# Altium footprint library Iris.PcbLib: 90 footprints (part 3 of 6)
Each footprint in its own frame and in the unit in brackets; x right, y up, seen from the top. Pads: shape width x height; smd on the part's side, far side on the other; paste and mask are expansions set on the pad; w line width, h text height; cw(c..) or ccw(c..) is an arc to the next point about the centre after c.
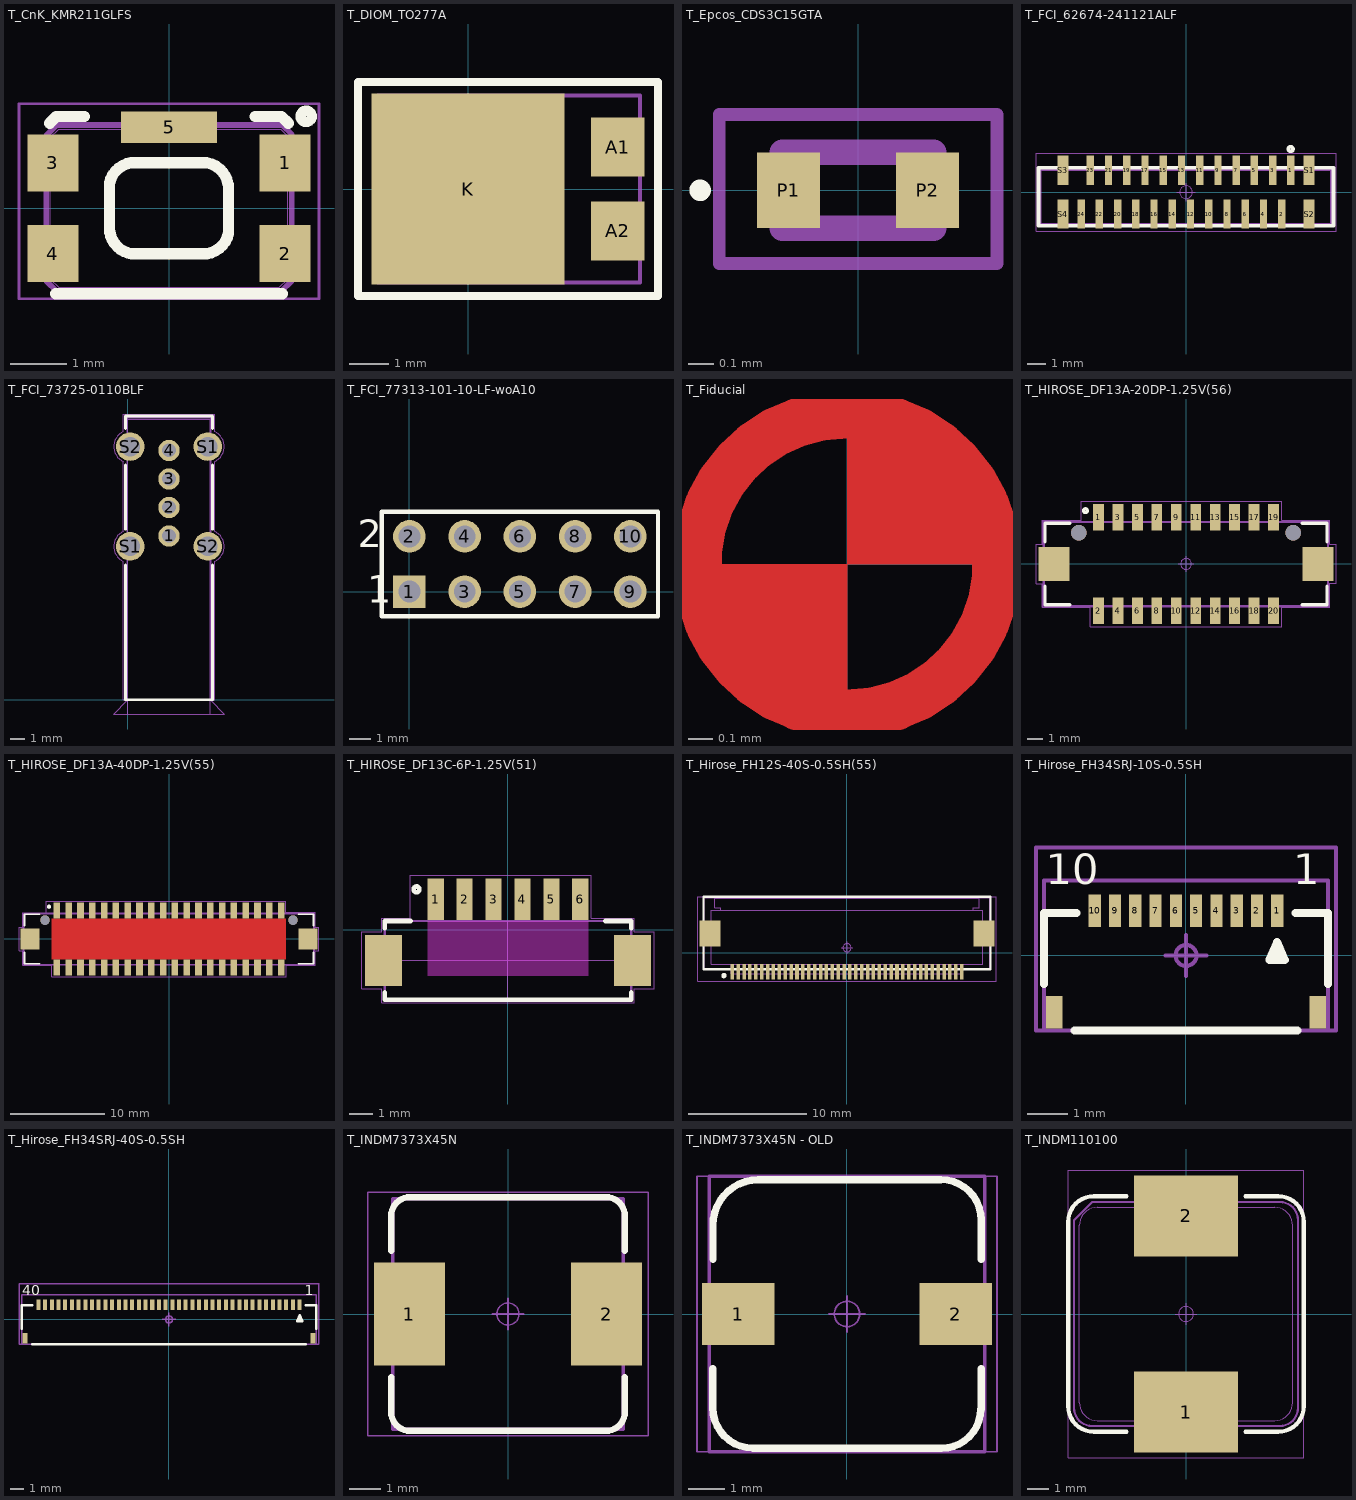
[diagram p2: the footprints below, top view; thin cyan lines are the x and y axes]

## T_CnK_KMR211GLFS [mm] "Microminiature Tact Switch for SMT"
height 1.9
pads (5):
  rect 0.9x1 smd: 1(2.05,0.8) 2(2.05,-0.8) 3(-2.05,0.8) 4(-2.05,-0.8)
  rect 1.7x0.55 smd: 5(0,1.43)
Top Overlay:
  circle w0.18: c2.424,1.624 r0.1
  lines w0.2: -2.109,1.502 -1.991,1.62 -1.5,1.62 ; -2,-1.51 2,-1.51 ; -1.05,-0.36 -1.05,0.44 ; -1.05,-0.35 ccw(c-0.59,-0.35) -0.662,-0.804 ; -1.05,0.444 cw(c-0.6,0.35) -0.669,0.805 ; -0.66,0.805 0.66,0.805 ; -0.655,-0.805 0.65,-0.805 ; 0.669,-0.805 ccw(c0.6,-0.35) 1.05,-0.444 ; 0.684,0.8 cw(c0.59,0.35) 1.045,0.419 ; 1.05,-0.44 1.05,0.4 ; 1.52,1.621 1.989,1.621 2.108,1.502
Mechanical 1:
  lines w0.05: -2.65,-1.6 -2.65,1.845 2.65,1.845 2.65,-1.6 -2.65,-1.6
Mechanical 2:
  lines w0.001: -2.1,-1.25 -2.1,1.25 -1.95,1.4 1.97,1.4 2.1,1.27 2.1,-1.25 1.95,-1.4 -1.95,-1.4 -2.1,-1.25
Mechanical 3:
  lines w0.1: -2.17,-1.28 -2.17,1.28 -1.98,1.47 2,1.47 2.17,1.3 2.17,-1.28 1.98,-1.47 -1.98,-1.47 -2.17,-1.28
3D body: height 2.12, standoff 0.02, extent -2.299,-1.509 2.301,1.491

## T_DIOM_TO277A [mm] "Molded Diode, 3-Leads, Body 4.75x6.65mm, IPC Medium Density"
height 1.2
pads (3):
  rect 1.35x1.5 smd: A1(3.805,1.065) A2(3.805,-1.065)
  rect 4.9x4.85 smd paste-0.5: K(0,0)
Top Overlay:
  lines w0.2: -2.794,-2.718 4.826,-2.718 4.826,2.718 -2.794,2.718 -2.794,-2.718
Mechanical 1:
  lines w0.1: -2.794,-2.718 4.826,-2.718 4.826,2.718 -2.794,2.718 -2.794,-2.718
Mechanical 2:
  lines w0.001: -2.281,-2.375 -2.281,2.375 4.369,2.375 4.369,-2.375 -2.281,-2.375
Mechanical 3:
  lines w0.1: -2.281,-2.375 4.369,-2.375 4.369,2.375 -2.281,2.375 -2.281,-2.375
3D body: height 1.2, standoff 0, extent -2.281,-2.375 4.369,2.375

## T_Epcos_CDS3C15GTA [mm] "Bidirectional ESD Protection"
height 0.27
pads (2):
  rect 0.25x0.3 smd: P1(-0.275,0) P2(0.275,0)
Top Overlay:
  circle w0.06: c-0.625,0 r0.012
Mechanical 1:
  lines w0.05: -0.55,-0.29 -0.55,0.3 0.55,0.3 0.55,-0.29 -0.55,-0.29
Mechanical 2:
  lines w0.001: -0.315,-0.165 -0.315,0.165 0.315,0.165 0.315,-0.165 -0.315,-0.165
Mechanical 3:
  lines w0.1: -0.3,-0.15 -0.3,0.15 0.3,0.15 0.3,-0.15 -0.3,-0.15
3D body: height 0.27, standoff 0, extent -0.315,-0.165 0.315,0.165

## T_FCI_62674-241121ALF [mm] "DVI FFC Connector 0.5mm pitch"
height 4.1
pads (28):
  rect 0.4x1.6 smd: 1(5.75,1.2) 2(5.25,-1.2) 3(4.75,1.2) 4(4.25,-1.2) 5(3.75,1.2) 6(3.25,-1.2) 7(2.75,1.2) 8(2.25,-1.2) 9(1.75,1.2) 10(1.25,-1.2) 11(0.75,1.2) 12(0.25,-1.2) 13(-0.25,1.2) 14(-0.75,-1.2) 15(-1.25,1.2) 16(-1.75,-1.2) 17(-2.25,1.2) 18(-2.75,-1.2) 19(-3.25,1.2) 20(-3.75,-1.2) 21(-4.25,1.2) 22(-4.75,-1.2) 23(-5.25,1.2) 24(-5.75,-1.2)
  rect 0.6x1.6 smd: S1(6.75,1.2) S2(6.75,-1.199) S3(-6.75,1.2) S4(-6.75,-1.2)
Top Overlay:
  circle w0.2: c5.742,2.367 r0.125
  lines w0.2: -8.089,-1.836 8.086,-1.836 8.086,1.342 -8.086,1.342 -8.086,-1.831
Mechanical 1:
  circle w0.05: c0,0 r0.35
  lines w0.05: -0.5,0 0.5,0 ; 0,-0.5 0,0.5 ; -8.226,-2.141 8.226,-2.141 8.226,2.141 -8.226,2.141 -8.226,-2.141
Mechanical 2:
  lines w0.001: -7.95,-1.7 7.95,-1.7 7.95,1.2 -7.95,1.2 -7.95,-1.7
Mechanical 3:
  lines w0.1: -8.011,-1.761 8.011,-1.761 8.011,1.276 -8.011,1.276 -8.011,-1.761

## T_FCI_73725-0110BLF [mm] "USB Type A Connector Vertical"
height 13.83
pads (8):
  round 1.5 hole 0.95: 1(2.88,11.49) 2(2.88,13.49) 3(2.88,15.49) 4(2.88,17.49)
  round 2 hole 1.37: S1(0.16,10.76) S1(5.6,17.76) S2(0.16,17.76) S2(5.6,10.76)
Top Overlay:
  lines w0.2: -0.166,9.463 -0.166,0 5.926,0 5.926,9.463 ; -0.166,11.964 -0.166,16.474 ; -0.166,19.025 -0.166,19.898 5.926,19.898 5.926,19.025 ; 5.922,11.964 5.922,16.474
Mechanical 1:
  lines w0.05: -0.322,9.709 -0.322,0 6.081,0 6.081,9.707 ; -0.322,18.812 -0.322,20.046 -0.32,20.048 6.081,20.048 ; -0.321,9.708 cw(c0.16,10.76) -0.322,11.812 ; -0.321,11.813 -0.321,16.708 cw(c0.16,17.76) -0.322,18.812 ; 6.081,16.707 6.081,11.812 cw(c5.6,10.76) 6.082,9.708 ; 6.081,18.812 cw(c5.6,17.76) 6.082,16.708 ; 6.082,18.814 6.082,20.048
Mechanical 2:
  lines w0.001: 0,-1 0,19.678 5.76,19.678 5.76,-1 ; -1,-1 0,0 5.76,0 6.76,-1 -1,-1
Mechanical 3:
  lines w0.1: -0.068,19.778 5.826,19.778 5.826,0 -0.065,0 -0.065,19.778
3D body: height 14.57, standoff -3.59, extent -0.665,-0.758 6.455,18.498

## T_FCI_77313-101-10-LF-woA10 [mm] "2.54 mm header"
height 10.8
pads (10):
  rect 1.5x1.5 hole 1: 1(0,0)
  round 1.5 hole 1: 2(0,2.54) 3(2.54,0) 4(2.54,2.54) 5(5.08,0) 6(5.08,2.54) 7(7.62,0) 8(7.62,2.54) 9(10.16,0) 10(10.16,2.54)
Top Overlay:
  lines w0.2: -1.27,-1.14 11.43,-1.14 ; -1.27,-1.137 -1.27,3.68 11.43,3.68 11.43,-1.137
  text "1" at -1.941,-0.522 h1.27
  text "2" at -2.364,2.048 h1.27
Mechanical 1:
  lines w0.05: -1.27,-1.14 11.43,-1.14 ; -1.27,-1.137 -1.27,3.68 11.43,3.68 11.43,-1.137
Mechanical 2:
  lines w0.001: -1.27,-1.14 -1.27,3.68 11.43,3.68 11.43,-1.14 -1.27,-1.14
Mechanical 3:
  lines w0.1: -1.27,-1.14 11.43,-1.14 ; -1.27,-1.137 -1.27,3.68 11.43,3.68 11.43,-1.137
3D body: height 8.39, standoff -2.41, extent -1.07,-1.145 11.23,3.685

## T_Fiducial [mm] "Fiducial"
Top Layer:
  region: 0.625,0 0,0 0,0.625 0.375,0.5 0.625,0.25
  region: 0,-0.625 -0.375,-0.5 -0.625,-0.25 -0.625,0 0,0
  lines w0.203: 0,-0.625 cw(c0,0) 0,0.625 cw(c0,0) 0,-0.625
Top Solder:
  circle w0.203: c0,0 r0.625
  region: 0.625,0 0.5,-0.375 0.25,-0.625 -0.25,-0.625 -0.5,-0.375 -0.625,0 -0.5,0.375 -0.375,0.5 0,0.625 0.375,0.5 0.5,0.25 0.5,0.375 0.375,0.5

## T_HIROSE_DF13A-20DP-1.25V(56) [mm]
height 4.8
pads (24):
  rect 0.7x1.7 smd: 1(-5.625,3) 2(-5.625,-3) 3(-4.375,3) 4(-4.375,-3) 5(-3.125,3) 6(-3.125,-3) 7(-1.875,3) 8(-1.875,-3) 9(-0.625,3) 10(-0.625,-3) 11(0.625,3) 12(0.625,-3) 13(1.875,3) 14(1.875,-3) 15(3.125,3) 16(3.125,-3) 17(4.375,3) 18(4.375,-3) 19(5.625,3) 20(5.625,-3)
  rect 2x2.2 smd: ""(-8.475,0) ""(8.475,0)
  round 1 hole 1 unplated paste+0 mask+0: ""(-6.875,2) ""(6.875,2)
Top Overlay:
  circle w0.2: c-6.455,3.42 r0.125
  lines w0.2: -9.04,-1.42 -9.04,-2.62 -7.463,-2.62 ; -9.04,1.41 -9.04,2.61 -7.463,2.61 ; 7.463,-2.62 9.04,-2.62 9.04,-1.42 ; 7.463,2.61 9.04,2.61 9.04,1.41
Mechanical 1:
  circle w0.05: c0,0 r0.35
  lines w0.05: -0.5,0 0.5,0 ; 0,-0.5 0,0.5 ; 9.222,1.255 9.222,2.804 8.052,2.804 6.136,2.804 6.136,4.01 -6.726,4.01 -6.726,2.796 -9.216,2.796 -9.216,1.652 -9.216,1.252 -9.63,1.252 -9.63,-1.258 -9.218,-1.258 -9.218,-2.796 -6.142,-2.796 -6.142,-4.02 6.143,-4.02 6.143,-2.796 9.221,-2.796 9.221,-1.248 9.63,-1.248 ; 9.224,1.255 9.63,1.255 9.63,-1.237
Mechanical 2:
  lines w0.001: -9.175,-2.75 9.175,-2.75 9.175,2.75 -9.175,2.75 -9.175,-2.75
Mechanical 3:
  lines w0.1: -9.1,-2.68 9.1,-2.68 9.1,2.67 -9.1,2.67 -9.1,-2.68
3D body: height 4.8, standoff 0, extent -9.175,-3.45 9.175,3.45

## T_HIROSE_DF13A-40DP-1.25V(55) [mm]
height 4.8
pads (44):
  rect 0.7x1.7 smd: 1(-11.875,3) 2(-11.875,-3) 3(-10.625,3) 4(-10.625,-3) 5(-9.375,3) 6(-9.375,-3) 7(-8.125,3) 8(-8.125,-3) 9(-6.875,3) 10(-6.875,-3) 11(-5.625,3) 12(-5.625,-3) 13(-4.375,3) 14(-4.375,-3) 15(-3.125,3) 16(-3.125,-3) 17(-1.875,3) 18(-1.875,-3) 19(-0.625,3) 20(-0.625,-3) 21(0.625,3) 22(0.625,-3) 23(1.875,3) 24(1.875,-3) 25(3.125,3) 26(3.125,-3) 27(4.375,3) 28(4.375,-3) 29(5.625,3) 30(5.625,-3) 31(6.875,3) 32(6.875,-3) 33(8.125,3) 34(8.125,-3) 35(9.375,3) 36(9.375,-3) 37(10.625,3) 38(10.625,-3) 39(11.875,3) 40(11.875,-3)
  rect 2x2.2 smd: ""(-14.725,0) ""(14.725,0)
  round 1 hole 1 unplated paste+0 mask+0: ""(-13.125,2) ""(13.125,2)
Top Layer:
  pour cut-out: -12.4,-2.15 12.375,-2.15 12.375,2.15 -12.4,2.15
Top Overlay:
  circle w0.2: c-12.705,3.42 r0.125
  lines w0.2: -15.29,-1.42 -15.29,-2.62 -13.713,-2.62 ; -15.29,1.41 -15.29,2.61 -13.713,2.61 ; 13.713,-2.62 15.29,-2.62 15.29,-1.42 ; 13.713,2.61 15.29,2.61 15.29,1.41
Mechanical 1:
  circle w0.05: c0,0 r0.35
  lines w0.05: -0.5,0 0.5,0 ; 0,-0.5 0,0.5 ; 15.472,1.255 15.472,2.804 14.302,2.804 12.386,2.804 12.386,4.01 -12.976,4.01 -12.976,2.796 -15.466,2.796 -15.466,1.652 -15.466,1.252 -15.88,1.252 -15.88,-1.258 -15.468,-1.258 -15.468,-2.796 -12.392,-2.796 -12.392,-4.02 12.393,-4.02 12.393,-2.796 15.471,-2.796 15.471,-1.248 15.88,-1.248 ; 15.474,1.255 15.88,1.255 15.88,-1.237
Mechanical 2:
  lines w0.001: -15.425,-2.75 15.425,-2.75 15.425,2.75 -15.425,2.75 -15.425,-2.75
Mechanical 3:
  lines w0.1: -15.35,-2.68 15.35,-2.68 15.35,2.67 -15.35,2.67 -15.35,-2.68
3D body: height 4.82, standoff 0.02, extent -15.425,-3.45 15.425,3.45

## T_HIROSE_DF13C-6P-1.25V(51) [mm] "Touch connector"
height 4.8
pads (8):
  rect 0.7x1.8 smd: 1(-3.125,1.325) 2(-1.875,1.325) 3(-0.625,1.325) 4(0.625,1.325) 5(1.875,1.325) 6(3.125,1.325)
  rect 1.6x2.2 smd: ""(-5.385,-1.324) ""(5.385,-1.324)
Top Overlay:
  circle w0.2: c-3.955,1.745 r0.125
  lines w0.2: -5.325,-2.713 -5.325,-3.024 5.325,-3.024 5.325,-2.713 ; -5.325,0.064 -5.325,0.376 -4.201,0.376 ; 4.201,0.376 5.325,0.376 5.325,0.064
Keep-Out Layer:
  rectangle: -3.475,-1.994 3.475,0.376
Mechanical 1:
  lines w0.05: -6.316,-2.555 -6.316,-0.093 -5.456,-0.093 -5.456,0.506 -4.226,0.506 -4.226,2.354 3.606,2.354 3.606,0.507 5.456,0.507 5.456,-0.092 6.316,-0.093 6.316,-2.555 5.456,-2.555 5.456,-3.155 -5.456,-3.155 -5.456,-2.555 -6.316,-2.555
Mechanical 2:
  region: -5.991,-1.074 -5.45,-1.074 -5.45,-1.575 -5.991,-1.575
  lines w0.001: -5.325,-2.224 -6.075,-2.224 -6.075,-0.424 -5.325,-0.424 ; -5.325,-1.324 5.325,-1.324 ; 0,-3.024 0,0.376 ; 5.325,-2.224 6.075,-2.224 6.075,-0.424 5.325,-0.424 ; -5.325,-3.024 -5.325,0.376 5.325,0.376 5.325,-3.024 -5.325,-3.024
Mechanical 3:
  lines w0.1: -5.325,-3.024 -5.325,0.376 5.325,0.376 5.325,-3.024 -5.325,-3.024
3D body: height 4.82, standoff 0.02, extent -6.075,-3.025 6.075,1.875

## T_Hirose_FH12S-40S-0.5SH(55) [mm] "DVI FFC Connector 0.5mm pitch"
height 2
pads (42):
  rect 0.3x1.3 smd: 1(-9.75,-1.625) 2(-9.25,-1.625) 3(-8.75,-1.625) 4(-8.25,-1.625) 5(-7.75,-1.625) 6(-7.25,-1.625) 7(-6.75,-1.625) 8(-6.25,-1.625) 9(-5.75,-1.625) 10(-5.25,-1.625) 11(-4.75,-1.625) 12(-4.25,-1.625) 13(-3.75,-1.625) 14(-3.25,-1.625) 15(-2.75,-1.625) 16(-2.25,-1.625) 17(-1.75,-1.625) 18(-1.25,-1.625) 19(-0.75,-1.625) 20(-0.25,-1.625) 21(0.25,-1.625) 22(0.75,-1.625) 23(1.25,-1.625) 24(1.75,-1.625) 25(2.25,-1.625) 26(2.75,-1.625) 27(3.25,-1.625) 28(3.75,-1.625) 29(4.25,-1.625) 30(4.75,-1.625) 31(5.25,-1.625) 32(5.75,-1.625) 33(6.25,-1.625) 34(6.75,-1.625) 35(7.25,-1.625) 36(7.75,-1.625) 37(8.25,-1.625) 38(8.75,-1.625) 39(9.25,-1.625) 40(9.75,-1.625)
  rect 1.8x2.2 smd: ""(-11.65,1.625) ""(11.65,1.625)
Top Overlay:
  circle w0.2: c-10.459,-1.944 r0.125
  lines w0.2: -12.198,-1.411 -12.198,4.755 12.193,4.755 12.193,-1.411 -12.198,-1.411
Mechanical 1:
  circle w0.05: c0,0.425 r0.35
  lines w0.05: -0.5,0.425 0.5,0.425 ; 0,-0.075 0,0.925 ; -12.69,-2.415 -12.69,4.755 12.69,4.755 12.69,-2.415 -12.69,-2.415
Mechanical 2:
  lines w0.001: -10.75,3.625 -10.75,3.825 -11.25,3.825 -11.25,4.625 11.25,4.625 11.25,3.825 10.75,3.825 10.75,3.625 ; -9.85,-0.975 -9.85,-1.775 9.85,-1.775 9.85,-0.975 ; -12.05,1.025 -12.05,2.225 -11.55,2.225 -11.55,3.625 11.55,3.625 11.55,2.225 12.05,2.225 12.05,1.025 11.55,1.025 11.55,-0.975 -11.55,-0.975 -11.55,1.025 -12.05,1.025
Mechanical 3:
  lines w0.1: -12.125,-1.336 -12.125,4.689 12.12,4.689 12.12,-1.336 -12.125,-1.336

## T_Hirose_FH34SRJ-10S-0.5SH [mm] "FFC Connector, 10 pin, 0.5mm pitch, dual side contact"
height 1
pads (12):
  rect 0.3x0.8 smd: 1(2.25,1.1) 2(1.75,1.1) 3(1.25,1.1) 4(0.75,1.1) 5(0.25,1.1) 6(-0.25,1.1) 7(-0.75,1.1) 8(-1.25,1.1) 9(-1.75,1.1) 10(-2.25,1.1)
  rect 0.4x0.8 smd: ""(-3.25,-1.4) ""(3.25,-1.4)
Top Overlay:
  region: 2.323,0.114 2.154,0.114 2.154,-0.063 2.323,-0.063
  lines w0.2: -3.5,-0.7 -3.5,1.05 -2.7,1.05 ; -2.75,-1.85 2.75,-1.85 ; 2.7,1.05 3.5,1.05 3.5,-0.7 ; 2.056,-0.114 2.437,-0.114 2.246,0.331 2.056,-0.114
  text "1" at 2.647,1.758 h0.75
  text "10" at -3.466,1.758 h0.75
Mechanical 1:
  circle w0.1: c0,0 r0.259
  lines w0.1: -0.508,0 0.508,0 ; 0,-0.508 0,0.508 ; -3.7,-1.854 -3.7,2.667 3.7,2.667 3.7,-1.854 -3.7,-1.854
Mechanical 2:
  lines w0.005: -3.5,-1.85 3.5,-1.85 3.5,1.85 -3.5,1.85 -3.5,-1.85
Mechanical 3:
  lines w0.1: -3.5,-1.85 -3.5,1.85 3.5,1.85 3.5,-1.85 -3.5,-1.85
3D body: height 0.98, standoff -0.01, extent -3.5,-1.85 3.5,1.85

## T_Hirose_FH34SRJ-40S-0.5SH [mm] "FFC Connector, 40 pin, 0.5mm pitch, dual side contact"
height 1
pads (42):
  rect 0.3x0.8 smd: 1(9.75,1.1) 2(9.25,1.1) 3(8.75,1.1) 4(8.25,1.1) 5(7.75,1.1) 6(7.25,1.1) 7(6.75,1.1) 8(6.25,1.1) 9(5.75,1.1) 10(5.25,1.1) 11(4.75,1.1) 12(4.25,1.1) 13(3.75,1.1) 14(3.25,1.1) 15(2.75,1.1) 16(2.25,1.1) 17(1.75,1.1) 18(1.25,1.1) 19(0.75,1.1) 20(0.25,1.1) 21(-0.25,1.1) 22(-0.75,1.1) 23(-1.25,1.1) 24(-1.75,1.1) 25(-2.25,1.1) 26(-2.75,1.1) 27(-3.25,1.1) 28(-3.75,1.1) 29(-4.25,1.1) 30(-4.75,1.1) 31(-5.25,1.1) 32(-5.75,1.1) 33(-6.25,1.1) 34(-6.75,1.1) 35(-7.25,1.1) 36(-7.75,1.1) 37(-8.25,1.1) 38(-8.75,1.1) 39(-9.25,1.1) 40(-9.75,1.1)
  rect 0.4x0.8 smd: ""(-10.75,-1.4) ""(10.75,-1.4)
Top Overlay:
  region: 9.837,0.097 9.669,0.097 9.669,-0.081 9.837,-0.081
  lines w0.2: -11,-0.7 -11,1.05 -10.2,1.05 ; -10.2,-1.85 10.2,-1.85 ; 10.2,1.05 11,1.05 11,-0.7 ; 9.571,-0.132 9.952,-0.132 9.761,0.313 9.571,-0.132
  text "1" at 10.147,1.791 h0.75
  text "40" at -10.966,1.791 h0.75
Mechanical 1:
  circle w0.1: c0,0 r0.259
  lines w0.1: -0.508,0 0.508,0 ; 0,-0.508 0,0.508 ; 11.2,2.667 11.2,-1.854 -11.2,-1.854 -11.2,2.667 11.201,2.667
Mechanical 2:
  lines w0.005: -11,-1.85 11,-1.85 11,1.85 -11,1.85 -11,-1.85
Mechanical 3:
  lines w0.1: -11,-1.85 -11,1.85 10.998,1.85 10.998,-1.85 -11,-1.85
3D body: height 0.98, standoff -0.01, extent -11,-1.85 11,1.85

## T_INDM7373X45N [mm] "Inductor, 7.3mm X 7.3mm"
height 4.55
pads (2):
  rect 2.25x3.25 smd: 1(-3.125,0) 2(3.125,0)
Top Overlay:
  lines w0.2: -3.7,-2 -3.7,-3.1 ccw(c-3.1,-3.1) -3.1,-3.7 3.1,-3.7 ccw(c3.1,-3.1) 3.7,-3.1 3.7,-2 ; -3.7,3.1 cw(c-3.1,3.1) -3.1,3.7 3.1,3.7 cw(c3.1,3.1) 3.7,3.1 3.7,2 3.7,2.6 ; -3.696,2 -3.696,3.1
Mechanical 1:
  circle w0.05: c0,0 r0.35
  lines w0.05: -0.5,0 0.5,0 ; 0,-0.5 0,0.5 ; -4.445,-3.85 4.445,-3.85 4.445,3.85 -4.445,3.85 -4.445,-3.85
Mechanical 2:
  lines w0.001: -3.65,-3.65 3.65,-3.65 3.65,3.65 -3.65,3.65 -3.65,-3.65
Mechanical 3:
  lines w0.1: -3.65,-3.65 3.65,-3.65 3.65,3.65 -3.65,3.65 -3.65,-3.65
3D body: height 4, standoff 0, extent -3.65,-3.65 3.65,3.65

## T_INDM7373X45N - OLD [mm]
height 4.5
pads (2):
  rect 2x1.7 smd: 1(-3,0) 2(3,0)
Top Overlay:
  lines w0.2: -3.7,-1.5 -3.7,-2.59 ccw(c-2.594,-2.59) -2.594,-3.697 ; -3.696,1.5 -3.696,2.6 ; -3.696,2.452 cw(c-2.448,2.452) -2.448,3.7 2.588,3.7 ; -2.594,-3.7 2.609,-3.7 ccw(c2.609,-2.623) 3.686,-2.623 ; 2.588,3.708 cw(c2.588,2.596) 3.7,2.596 ; 3.7,-2.623 3.7,-1.5 ; 3.7,1.5 3.7,2.6
Mechanical 1:
  circle w0.05: c0,0 r0.35
  lines w0.05: -0.5,0 0.5,0 ; 0,-0.5 0,0.5 ; -4.135,-3.8 4.136,-3.8 4.136,3.8 -4.135,3.8 -4.135,-3.8
Mechanical 2:
  lines w0.001: -3.8,-3.8 3.8,-3.8 3.8,3.8 -3.8,3.8 -3.8,-3.8
Mechanical 3:
  lines w0.1: -3.8,-3.8 3.8,-3.8 3.8,3.8 -3.8,3.8 -3.8,-3.8
3D body: height 4.12, standoff 0.02, extent -3.65,-3.65 3.65,3.65

## T_INDM110100 [mm] "Inductor shielded, 11mm x 10mm (Bourns, SRP1038A; Vishay, IHLP4040DZ-8A)"
height 4
pads (2):
  rect 4.86x3.8 smd: 1(0,-4.6) 2(0,4.6)
Top Overlay:
  lines w0.2: -2.794,-5.523 -4.32,-5.523 cw(c-4.32,-4.32) -5.523,-4.32 -5.523,4.32 cw(c-4.32,4.32) -4.32,5.523 -2.794,5.523 ; 2.794,-5.523 4.32,-5.523 ccw(c4.32,-4.32) 5.523,-4.32 5.523,4.343 ; 2.794,5.523 4.32,5.523 cw(c4.32,4.32) 5.523,4.32
Mechanical 1:
  circle w0.05: c0,0 r0.35
  lines w0.05: -0.5,0 0.5,0 ; 0,-0.5 0,0.5 ; -5.52,-6.731 -5.52,6.731 5.52,6.731 5.52,-6.731 -5.52,-6.731
Mechanical 2:
  lines w0.001: -5,-4.15 ccw(c-4.15,-4.15) -4.15,-5 4.15,-5 ccw(c4.15,-4.15) 5,-4.15 5,4.15 ccw(c4.15,4.15) 4.15,5 -4.15,5 ccw(c-4.15,4.15) -5,4.15 -5,-4.15 ; -1.5,-5.5 -1.5,-3.2 1.5,-3.2 1.5,-5.5 -1.5,-5.5 ; -1.5,3.2 -1.5,5.5 1.5,5.5 1.5,3.2 -1.5,3.2
Mechanical 3:
  lines w0.1: -5.25,-4.4 ccw(c-4.4,-4.4) -4.4,-5.25 4.4,-5.25 ccw(c4.4,-4.4) 5.25,-4.4 5.25,4.4 ccw(c4.4,4.4) 4.4,5.25 -4.4,5.25 -5.25,4.4 -5.25,-4.4
3D body: height 3.8, standoff -0.2, extent -5,-5.2 5,5.2